# Altium footprint library PCB_Lib_Devzone.PcbLib: 491 footprints (part 18 of 31)
Each footprint in its own frame and in the unit in brackets; x right, y up, seen from the top. Pads: shape width x height; smd on the part's side, far side on the other; paste and mask are expansions set on the pad; w line width, h text height; cw(c..) or ccw(c..) is an arc to the next point about the centre after c.
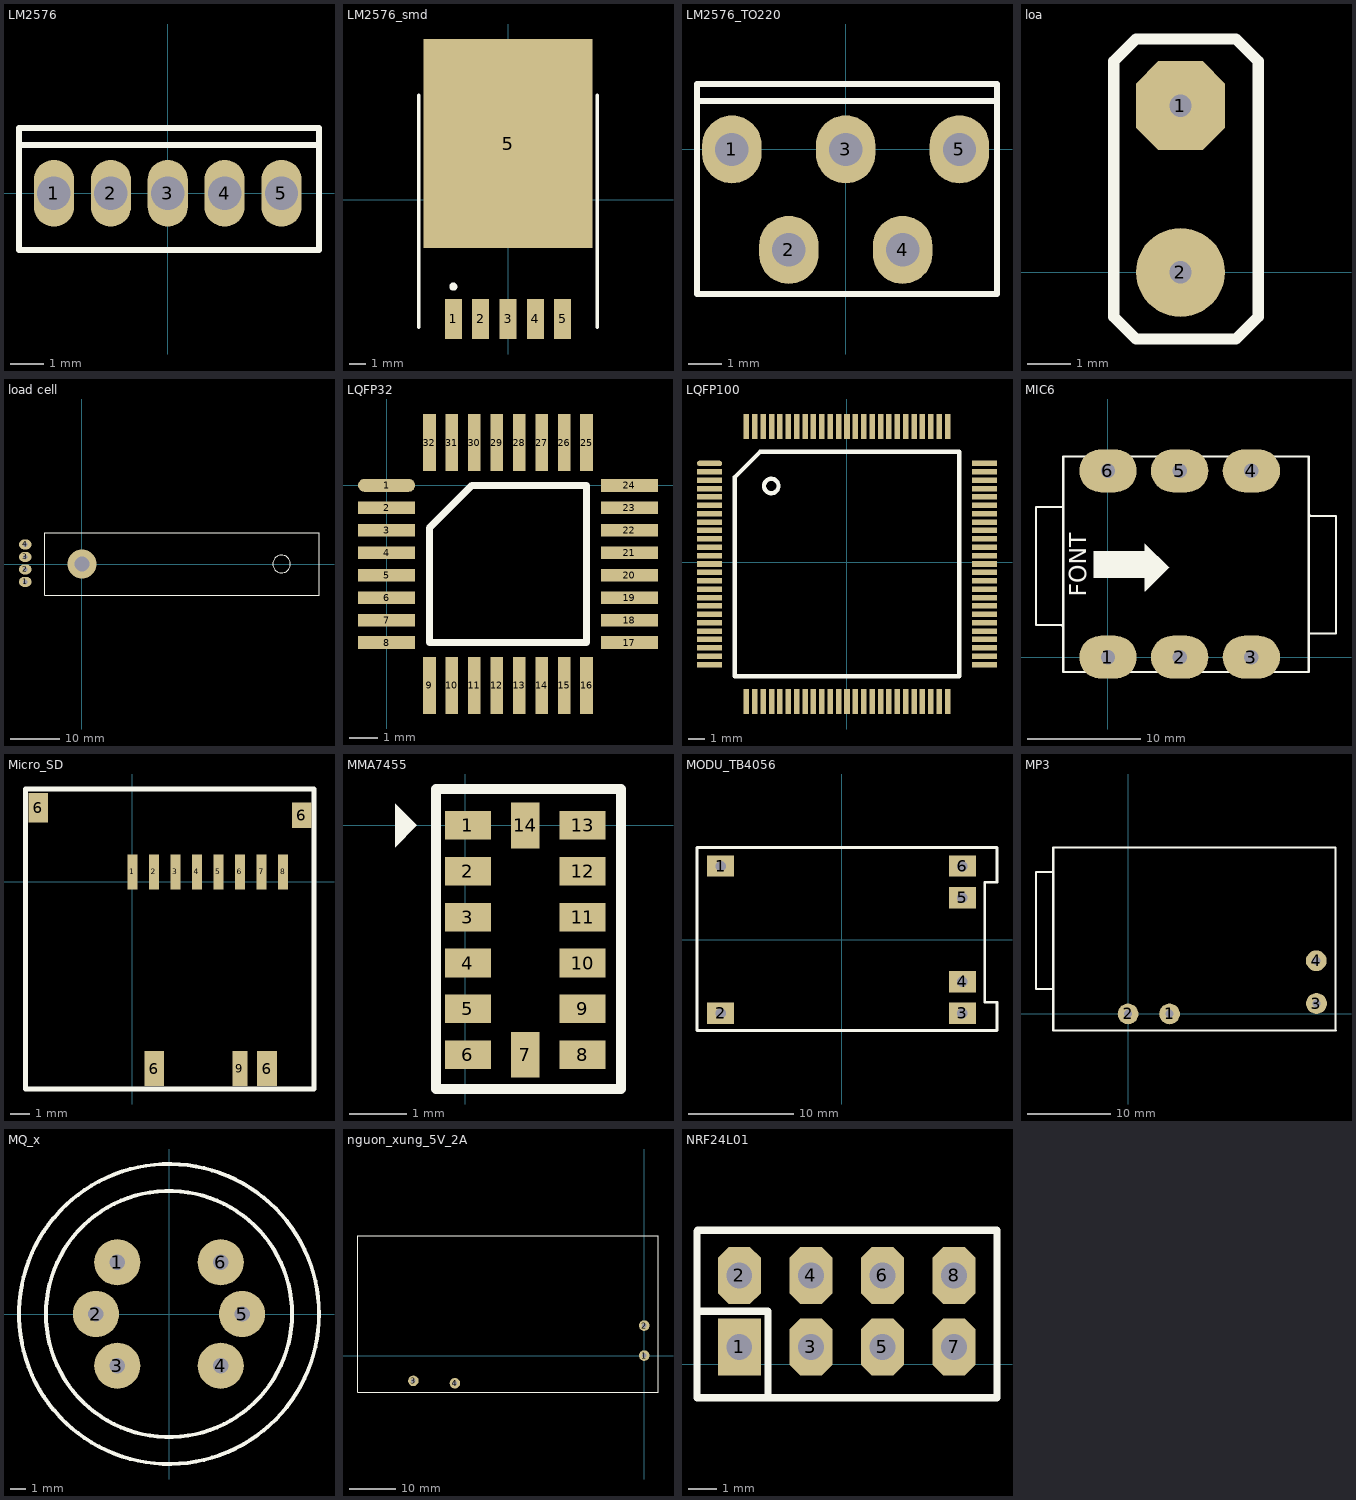
[diagram p17: the footprints below, top view; thin cyan lines are the x and y axes]

## LM2576 [mm]
pads (5):
  oval 1.2x2 hole 1: 1(-3.4,0) 2(-1.7,0) 3(0,0) 4(1.7,0) 5(3.4,0)
Top Overlay:
  lines w0.178: -4.445,1.448 4.47,1.448 ; -4.445,-1.702 -4.445,1.956 4.521,1.956 4.521,-1.702 -4.445,-1.702

## LM2576_smd [mm]
pads (6):
  rect 1.05x2.5 smd: 1(-3.4,-7.4) 2(-1.7,-7.4) 3(0,-7.4) 4(1.7,-7.4) 5(3.4,-7.4)
  rect 10.5x13 smd: 5(0,3.5)
Top Overlay:
  circle w0.25: c-3.4,-5.394 r0.125
  lines w0.2: -5.55,-7.944 -5.55,6.506 ; 5.55,-7.944 5.55,6.506

## LM2576_TO220 [mm]
pads (5):
  oval 1.778x2.032 hole 1: 1(-3.4,0) 2(-1.7,-3) 3(0,0) 4(1.7,-3) 5(3.4,0)
Top Overlay:
  lines w0.178: -4.445,1.448 4.47,1.448 ; -4.445,-4.318 4.521,-4.318 4.521,1.956 -4.445,1.956 -4.445,-4.318

## loa [mil]
pads (2):
  oct 80x80 hole 20: 1(-350,150)
  round 80 hole 20: 2(-350,0)
Top Overlay:
  lines w10: -410,-40 -390,-60 -300,-60 -280,-40 -280,190 -300,210 -390,210 -410,190 -410,-40

## load cell [mil]
height 2500
pads (4):
  oval 100x80 hole 39.37: 1(-455,-143) 2(-455,-43) 3(-455,57) 4(-455,157)
via 0,0 diameter 236.22 hole 118.11
Top Overlay:
  circle w10: c1600,0 r70.71
  lines w10: -300,-250 -300,250 1900,250 1900,-250 -300,-250

## LQFP32 [mil]
pads (32):
  oval 80x18 smd: 1(0,0)
  rect 80x18 smd: 2(0,-31.5) 3(0,-63) 4(0,-94.5) 5(0,-126) 6(0,-157.5) 7(0,-189) 8(0,-220.5) 17(340.5,-220.5) 18(340.5,-189) 19(340.5,-157.5) 20(340.5,-126) 21(340.5,-94.5) 22(340.5,-63) 23(340.5,-31.5) 24(340.5,0)
  rect 18x80 smd: 9(60,-280.5) 10(91.5,-280.5) 11(123,-280.5) 12(154.5,-280.5) 13(186,-280.5) 14(217.5,-280.5) 15(249,-280.5) 16(280.5,-280.5) 25(280.5,60) 26(249,60) 27(217.5,60) 28(186,60) 29(154.5,60) 30(123,60) 31(91.5,60) 32(60,60)
Top Overlay:
  lines w10: 60,-220.5 60,-60 120,0 280.5,0 280.5,-220.5 60,-220.5
3D body "User Library-lqfp32-1.STEP": height 59.06, standoff 0.79, extent -7.16,-287.16 347.17,67.17

## LQFP100 [mil]
pads (100):
  oval 59.06x13 smd: 1(-321.99,232.04)
  rect 59.06x13 smd: 2(-321.99,212.36) 3(-321.99,192.67) 4(-321.99,172.99) 5(-321.99,153.3) 6(-321.99,133.62) 7(-321.99,113.93) 8(-321.99,94.25) 9(-321.99,74.56) 10(-321.99,54.88) 11(-321.99,35.19) 12(-321.99,15.51) 13(-321.99,-4.18) 14(-321.99,-23.86) 15(-321.99,-43.55) 16(-321.99,-63.23) 17(-321.99,-82.92) 18(-321.99,-102.6) 19(-321.99,-122.29) 20(-321.99,-141.97) 21(-321.99,-161.66) 22(-321.99,-181.34) 23(-321.99,-201.03) 24(-321.99,-220.71) 25(-321.99,-240.4) 51(323.67,-240.4) 52(323.67,-220.71) 53(323.67,-201.03) 54(323.67,-181.34) 55(323.67,-161.66) 56(323.67,-141.97) 57(323.67,-122.29) 58(323.67,-102.6) 59(323.67,-82.92) 60(323.67,-63.23) 61(323.67,-43.55) 62(323.67,-23.86) 63(323.67,-4.18) 64(323.67,15.51) 65(323.67,35.19) 66(323.67,54.88) 67(323.67,74.56) 68(323.67,94.25) 69(323.67,113.93) 70(323.67,133.62) 71(323.67,153.3) 72(323.67,172.99) 73(323.67,192.67) 74(323.67,212.36) 75(323.67,232.04)
  rect 13x59.06 smd: 26(-235.38,-327.01) 27(-215.69,-327.01) 28(-196.01,-327.01) 29(-176.32,-327.01) 30(-156.64,-327.01) 31(-136.95,-327.01) 32(-117.27,-327.01) 33(-97.58,-327.01) 34(-77.9,-327.01) 35(-58.21,-327.01) 36(-38.53,-327.01) 37(-18.84,-327.01) 38(0.84,-327.01) 39(20.53,-327.01) 40(40.21,-327.01) 41(59.9,-327.01) 42(79.58,-327.01) 43(99.27,-327.01) 44(118.95,-327.01) 45(138.64,-327.01) 46(158.32,-327.01) 47(178.01,-327.01) 48(197.69,-327.01) 49(217.38,-327.01) 50(237.06,-327.01) 76(237.06,318.66) 77(217.38,318.66) 78(197.69,318.66) 79(178.01,318.66) 80(158.32,318.66) 81(138.64,318.66) 82(118.95,318.66) 83(99.27,318.66) 84(79.58,318.66) 85(59.9,318.66) 86(40.21,318.66) 87(20.53,318.66) 88(0.84,318.66) 89(-18.84,318.66) 90(-38.53,318.66) 91(-58.21,318.66) 92(-77.9,318.66) 93(-97.58,318.66) 94(-117.27,318.66) 95(-136.95,318.66) 96(-156.64,318.66) 97(-176.32,318.66) 98(-196.01,318.66) 99(-215.69,318.66) 100(-235.38,318.66)
Top Overlay:
  circle w10: c-176.97,179 r16.97
  lines w10: -262.62,-267.64 -262.62,199.92 -203.25,259.29 264.3,259.29 264.3,-267.64 -262.62,-267.64
3D body "User Library-LQFP100_Grid_0_5.STEP": height 62.99, standoff 0.03, extent -313.95,-318.96 315.97,310.96

## MIC6 [mil] "Jac Mic 6 pin to"
pads (6):
  oval 200x150 hole 50: 1(0,0) 2(250,0) 3(500,0) 4(500,650) 5(250,650) 6(0,650)
Top Overlay:
  region: -50,369 -50,277 130,277 129,278 129,230 130,230 212,312 213,312 129,396 129,369
  lines w7: -156,-51 -156,699 ; -156,89 -156,525 -158,523 -251,523 -251,112 -162,112 -156,106 ; -156,700 700,700 700,590 ; -155,-52 -154,-51 -153,-52 700,-52 700,82 ; 700,499 706,493 795,493 795,82 702,82 700,80 700,594
  text "FONT" at -75,210 h60

## Micro_SD [mil]
pads (13):
  rect 20x70 smd: 1(0,20) 2(42.86,20) 3(85.71,20) 4(128.57,20) 5(171.43,20) 6(214.29,20) 7(257.14,20) 8(300,20)
  rect 39.37x59.06 smd: 6(-187,148)
  rect 39.37x70 smd: 6(43.82,-371.26) 6(268.23,-371.26)
  rect 39.37x51.18 smd: 6(337,133)
  rect 30x70 smd: 9(214.29,-371.26)
Top Overlay:
  lines w10: -213,-412 -213,185 362,185 362,-412 -213,-412

## MMA7455 [mm]
pads (14):
  rect 0.8x0.5 smd: 1(0.051,0) 2(0.051,-0.8) 3(0.051,-1.6) 4(0.051,-2.4) 5(0.051,-3.2) 6(0.051,-4) 8(2.051,-4) 9(2.051,-3.2) 10(2.051,-2.4) 11(2.051,-1.6) 12(2.051,-0.8) 13(2.051,0)
  rect 0.5x0.8 smd: 7(1.051,-4) 14(1.051,0)
Top Overlay:
  region: -1.219,0.381 -0.838,0 -1.219,-0.381
  lines w0.178: -0.508,-4.572 -0.508,0.635 2.718,0.635 2.718,-4.597 ; 2.718,-4.597 -0.508,-4.597 2.718,-4.597

## MODU_TB4056 [mm]
pads (6):
  rect 2.54x2.032 hole 1: 1(-11.5,7) 2(-11.5,-7) 3(11.5,-7) 4(11.5,-4) 5(11.5,4) 6(11.5,7)
Top Overlay:
  lines w0.254: -13.741,-8.636 -13.741,8.763 -12.929,8.763 14.783,8.763 14.783,5.461 13.614,5.461 13.614,-5.944 14.783,-5.944 14.783,-8.636 -13.741,-8.636

## MP3 [mm]
pads (4):
  round 2.5 hole 1: 1(5.004,0) 2(0,0) 3(22.716,1.251) 4(22.691,6.407)
Top Overlay:
  lines w0.254: -9.093,2.997 -11.1,2.997 -11.1,17.069 -11.049,17.12 -9.017,17.12 ; -9.042,20.066 25.019,20.066 25.019,-2.007 ; -9.017,-2.007 -9.017,20.066 ; -8.992,-1.981 25.07,-1.981

## MQ_x [mm]
pads (6):
  round 3 hole 1: 1(-3.359,3.359) 2(-4.75,0) 3(-3.359,-3.359) 4(3.359,-3.359) 5(4.75,0) 6(3.359,3.359)
Top Overlay:
  circle w0.254: c0,0 r8
  circle w0.254: c0,0 r9.75

## new [mil]

## nguon_xung_5V_2A [mm]
pads (4):
  round 2.286 hole 1: 1(0,0) 2(0,6.5) 3(-50,-5.5) 4(-41,-6)
Top Overlay:
  lines w0.254: -62,-8 -62,-7.875 -62,-0.634 -62,26 -7.645,26 3,26 3,-8 -62,-8

## NRF24L01 [mil]
pads (8):
  rect 60x80 hole 36: 1(729,24)
  oct 60x80 hole 36: 2(729,124) 3(829,24) 4(829,124) 5(929,24) 6(929,124) 7(1029,24) 8(1029,124)
Top Overlay:
  lines w7.87: 669.89,185.89 671,187
  lines w10: 669.89,185.89 669.89,-46.86 1089,-46.86 1089,187 671,187 ; 673.01,74 769,74 769,-45
3D body "female_header_a-bl254-dg-g08d.stp": height 334.65, standoff -125.98, extent 676.16,-26 1086,170.85
3D body: height 476.37, standoff 450.28, extent 1075.01,-28 1077.01,176
3D body: height 476.37, standoff 450.28, extent 673.01,-28 675.01,176
3D body: height 477.37, standoff 445.28, extent 675.01,-28 1075.01,-26
3D body: height 476.37, standoff 435.28, extent 675.01,174 1075.01,176
3D body: height 475.58, standoff 435.28, extent 669.89,-46.86 1280.12,1094.87
3D body "User Library-HC-49_LT_THT_16MHz.STEP": height 617.32, standoff 397.24, extent 1093.48,185.57 1276.55,632.42
3D body "SW3dPS-NRF24L01P.STEP": height 533.89, standoff 475.58, extent 847.88,351.87 1006.15,510.13
3D body: height 475.96, standoff 450.37, extent 770.01,741.5 785.01,1069
3D body: height 475.96, standoff 450.37, extent 875.01,909 890.01,1069
3D body: height 475.96, standoff 450.37, extent 785.01,849 1080.01,864
3D body: height 475.96, standoff 450.37, extent 910.01,909 925.01,1069
3D body: height 475.96, standoff 450.37, extent 945.01,909 960.01,1069
3D body: height 475.96, standoff 450.37, extent 980.01,909 995.01,1069
3D body: height 475.96, standoff 450.37, extent 1015.01,909 1030.01,1069
3D body: height 475.96, standoff 450.37, extent 1050.01,909 1065.01,1069
3D body: height 475.96, standoff 450.96, extent 1065.01,1054 1260.01,1069
3D body: height 475.96, standoff 450.37, extent 840.01,1054 890.01,1069
3D body: height 475.96, standoff 450.37, extent 875.01,909 925.01,924
3D body: height 475.96, standoff 450.37, extent 910.01,1054 960.01,1069
3D body: height 475.96, standoff 450.37, extent 945.01,909 995.01,924
3D body: height 475.96, standoff 450.37, extent 980.01,1054 1030.01,1069
3D body: height 475.96, standoff 450.37, extent 1015.01,909 1065.01,924
3D body "User Library-Panasonic0603.STEP": height 493.3, standoff 475.58, extent 694.52,521.87 757.51,554.15
3D body "User Library-Panasonic0603.STEP": height 493.3, standoff 475.58, extent 700.52,293.87 763.51,326.15
3D body "User Library-Panasonic0603.STEP": height 493.3, standoff 475.58, extent 698.52,347.86 761.51,380.14
3D body "User Library-Panasonic0603.STEP": height 493.3, standoff 475.58, extent 768.87,677.51 801.15,740.5
3D body "User Library-Panasonic0603.STEP": height 493.3, standoff 475.58, extent 818.87,677.51 851.15,740.5
3D body "User Library-Panasonic0603.STEP": height 493.3, standoff 475.58, extent 1116.86,675.51 1149.14,738.51
3D body "User Library-Panasonic0603.STEP": height 493.3, standoff 475.58, extent 1162.87,675.5 1195.15,738.5
3D body "User Library-Panasonic0603.STEP": height 493.3, standoff 475.58, extent 698.5,399.85 761.5,432.13
3D body "User Library-CAPC1608X09.STEP": height 511.02, standoff 475.58, extent 1209.27,675.5 1240.76,738.49
3D body "User Library-CAPC1608X09.STEP": height 511.02, standoff 475.58, extent 946.27,674.5 977.76,737.49
3D body "User Library-CAPC1608X09.STEP": height 511.02, standoff 475.58, extent 1002.27,675.5 1033.76,738.49
3D body "User Library-CAPC1608X09.STEP": height 511.02, standoff 475.58, extent 898.52,539.26 961.51,570.76
3D body "User Library-CAPC1608X09.STEP": height 511.02, standoff 475.58, extent 870.52,585.26 933.51,616.76
3D body "User Library-CAPC1608X09.STEP": height 511.02, standoff 475.58, extent 947.51,585.26 1010.51,616.76
3D body "User Library-CAPC1608X09.STEP": height 511.02, standoff 475.58, extent 700.52,241.26 763.51,272.75
3D body: height 475.96, standoff 450.37, extent 840.01,909 855.01,1069
3D body: height 475.96, standoff 450.37, extent 805.01,909 820.01,1069
3D body: height 475.96, standoff 450.37, extent 805.01,909 855.01,924
3D body: height 475.96, standoff 450.37, extent 770.01,1054 820.01,1069
3D body "User Library-CAPC1608X09.STEP": height 511.02, standoff 475.58, extent 1164.26,62.5 1195.76,125.5
3D body "User Library-Header_Male_4Pin.STEP": height 546.39, standoff 92.06, extent 675.01,72.03 1075.01,170.06
3D body "User Library-Header_Male_4Pin.STEP": height 546.39, standoff 92.06, extent 675.01,-26 1075.01,72.03
3D body: height 482.14, standoff 419.15, extent 1157.64,476.5 1220.37,539.17
3D body: height 482.14, standoff 419.15, extent 1157.64,280.5 1220.37,343.17
3D body: height 512.14, standoff 449.15, extent 997.64,93.67 1060.37,156.33
3D body: height 512.14, standoff 449.15, extent 997.64,-7.5 1060.37,55.17
3D body: height 512.14, standoff 449.15, extent 897.64,93.67 960.37,156.33
3D body: height 512.14, standoff 449.15, extent 897.64,-7.5 960.37,55.17
3D body: height 512.14, standoff 449.15, extent 797.64,93.67 860.37,156.33
3D body: height 512.14, standoff 449.15, extent 797.64,-7.5 860.37,55.17
3D body: height 512.14, standoff 449.15, extent 697.64,93.67 760.37,156.33
3D body: height 512.14, standoff 449.15, extent 697.64,-7.5 760.37,55.17
3D body: height 478.58, standoff 472.58, extent 1070.03,853.52 1076.01,859.49